# Altium footprint library Components.PcbLib: 260 footprints (part 1 of 17)
Each footprint in its own frame and in the unit in brackets; x right, y up, seen from the top. Pads: shape width x height; smd on the part's side, far side on the other; paste and mask are expansions set on the pad; w line width, h text height; cw(c..) or ccw(c..) is an arc to the next point about the centre after c.
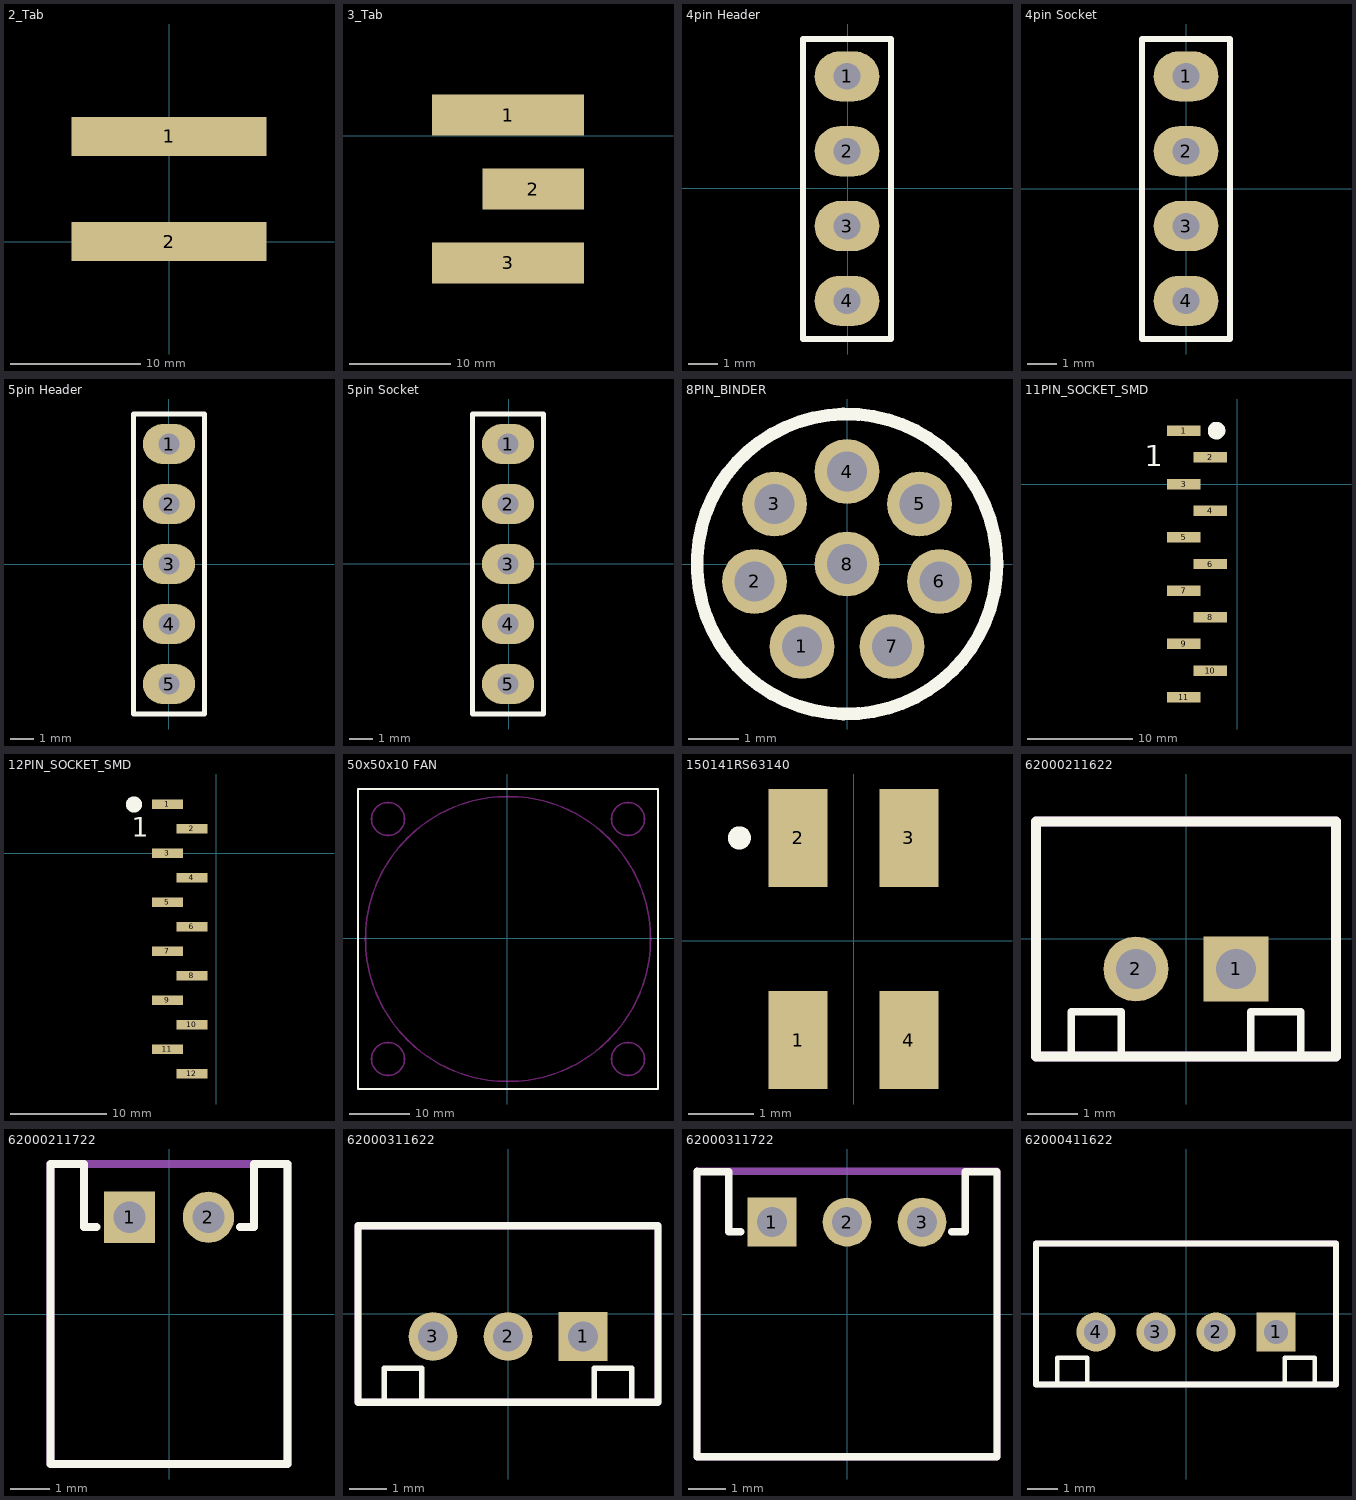
[diagram p0: the footprints below, top view; thin cyan lines are the x and y axes]

## 2_Tab [mm] "3mmx15mm TAB for LV_module (2017)"
pads (2):
  rect 15x3 smd: 1(0,8.1) 2(0,0)

## 3_Tab [mm]
pads (3):
  rect 15x4 smd: 1(-30.775,2.05) 3(-30.775,-12.55)
  rect 10x4 smd: 2(-28.275,-5.25)

## 4pin Header [mm]
pads (4):
  oval 2.2x1.7 hole 0.9: 1(-0.025,3.8) 2(-0.025,1.26) 3(-0.025,-1.28) 4(-0.025,-3.82)
Top Overlay:
  lines w0.2: -1.525,-5.115 1.475,-5.115 1.475,5.07 -1.525,5.07 -1.525,-5.115
3D body "BG030-04-X-0450-0300-X-X_revG.step": height 7.03, standoff -3.01, extent -1.27,-5.09 1.23,5.07

## 4pin Socket [mm]
pads (4):
  oval 2.2x1.7 hole 0.9: 1(0,3.82) 2(0,1.28) 3(0,-1.26) 4(0,-3.8)
Top Overlay:
  lines w0.2: -1.5,-5.095 1.5,-5.095 1.5,5.09 -1.5,5.09 -1.5,-5.095
3D body "tuskesor2_asm.stp": height 8.5, standoff -3.5, extent -1.5,-5.505 1.5,5.395

## 5pin Header [mm]
pads (5):
  oval 2.2x1.7 hole 0.9: 1(0,5.1) 2(0,2.56) 3(0,0.02) 4(0,-2.52) 5(0,-5.06)
Top Overlay:
  lines w0.2: -1.5,-6.33 -1.5,6.37 1.5,6.37 1.5,-6.33 -1.5,-6.33
3D body "BG030-05-X-0450-0300-X-X_revG.step": height 7.03, standoff -3.01, extent -1.245,-6.33 1.255,6.37

## 5pin Socket [mm]
pads (5):
  oval 2.2x1.7 hole 0.9: 1(-0.025,5.075) 2(-0.025,2.535) 3(-0.025,-0.005) 4(-0.025,-2.545) 5(-0.025,-5.085)
Top Overlay:
  lines w0.2: -1.525,-6.355 -1.525,6.345 1.475,6.345 1.475,-6.355 -1.525,-6.355
3D body "BG130-05-X-0350-X-X_revE.step": height 8.5, standoff -3.5, extent -1.525,-6.75 1.475,6.75

## 8PIN_BINDER [mm]
pads (8):
  round 1.3 hole 0.8: 1(-0.9,-1.65) 2(-1.85,-0.35) 3(-1.45,1.2) 4(0,1.85) 5(1.45,1.2) 6(1.85,-0.35) 7(0.9,-1.65) 8(0,0)
Top Overlay:
  circle w0.254: c0,0 r3
3D body "09-0428-90-08.stp": height 2.8, standoff -11.9, extent -7.5,-7.5 7.5,7.5

## 11PIN_SOCKET_SMD [mm]
pads (11):
  rect 3.2x1 smd: 1(-5.08,5.08) 2(-2.54,2.54) 3(-5.08,0) 4(-2.54,-2.54) 5(-5.08,-5.08) 6(-2.54,-7.62) 7(-5.08,-10.16) 8(-2.54,-12.7) 9(-5.08,-15.24) 10(-2.54,-17.78) 11(-5.08,-20.32)
Top Overlay:
  circle w1: c-1.96,5.1 r0.335
  text "1" at -8.8,1.7 h2

## 12PIN_SOCKET_SMD [mm]
pads (12):
  rect 3.2x1 smd: 1(-5.08,5.08) 2(-2.54,2.54) 3(-5.08,0) 4(-2.54,-2.54) 5(-5.08,-5.08) 6(-2.54,-7.62) 7(-5.08,-10.16) 8(-2.54,-12.7) 9(-5.08,-15.24) 10(-2.54,-17.78) 11(-5.08,-20.32) 12(-2.54,-22.86)
Top Overlay:
  circle w1: c-8.56,5.075 r0.335
  text "1" at -8.8,1.7 h2

## 50x50x10 FAN [mm]
Top Overlay:
  lines w0.254: -24.9,-25.1 -24.9,24.9 25.1,24.9 25.1,-25.1 -24.9,-25.1
Multi-Layer keep-out:
  circle w0.254: c0.1,-0.1 r23.75
  circle w0.254: c-19.9,19.9 r2.75
  circle w0.254: c-19.9,-20.1 r2.75
  circle w0.254: c20.1,-20.1 r2.75
  circle w0.254: c20.1,19.9 r2.75
3D body "JAMICO FAN 50X50X10.stp": height 10, standoff 0, extent -25.4,-25.6 25.6,25.4

## 150141RS63140 [mm]
pads (4):
  rect 0.9x1.5 smd: 1(-0.85,-1.525) 2(-0.85,1.575) 3(0.85,1.575) 4(0.85,-1.525)
Top Overlay:
  circle w0.254: c-1.75,1.575 r0.05

## 62000211622 [mm] "2.00mm Male Vertical Shrouded Header, 2p"
height 6.1
pads (2):
  rect 1.3x1.3 hole 0.8: 1(1,-0.6)
  round 1.3 hole 0.8: 2(-1,-0.6)
Top Overlay:
  lines w0.15: -2.3,-2.35 -2.3,-1.45 -1.3,-1.45 -1.3,-2.35 ; 1.3,-2.35 1.3,-1.45 2.3,-1.45 2.3,-2.35
  lines w0.2: -3,-2.35 3,-2.35 3,2.35 -3,2.35 -3,-2.35
Mechanical 13:
  lines w0.2: -3,-2.35 -3,2.35 3,2.35 3,-2.35 -3,-2.35
3D body "62000211622.stp": height 6.15, standoff -3.35, extent -3,-2.35 3,2.35

## 62000211722 [mm] "2.00mm Male Horizontal Shrouded Header, 2p"
height 4.5
pads (2):
  rect 1.3x1.3 hole 0.8: 1(-1,2.45)
  round 1.3 hole 0.8: 2(1,2.45)
Top Overlay:
  lines w0.2: -1.84,2.2 -2.15,2.2 -2.15,3.8 -3,3.8 -3,-3.8 3,-3.8 3,3.8 2.15,3.8 2.15,2.2 1.8,2.2
Mechanical 13:
  lines w0.2: -3,-3.8 -3,3.8 3,3.8 3,-3.8 -3,-3.8
3D body "62000211722.stp": height 4.85, standoff -3.24, extent -3,-3.8 3,3.8

## 62000311622 [mm] "2.00mm Male Vertical Shrouded Header, 3p"
height 6.1
pads (3):
  rect 1.3x1.3 hole 0.8: 1(2,-0.6)
  round 1.3 hole 0.8: 2(0,-0.6) 3(-2,-0.6)
Top Overlay:
  lines w0.15: -3.3,-2.35 -3.3,-1.45 -2.3,-1.45 -2.3,-2.35 ; 2.3,-2.35 2.3,-1.45 3.3,-1.45 3.3,-2.35
  lines w0.2: -4,-2.35 -4,2.35 4,2.35 4,-2.35 -4,-2.35
Mechanical 13:
  lines w0.2: -4,-2.35 4,-2.35 4,2.35 -4,2.35 -4,-2.35
3D body "62000311622.stp": height 6.15, standoff -3.35, extent -4,-2.35 4,2.35

## 62000311722 [mm] "2.00mm Male Horizontal Shrouded Header, 3p"
height 4.5
pads (3):
  rect 1.3x1.3 hole 0.8: 1(-2,2.45)
  round 1.3 hole 0.8: 2(0,2.45) 3(2,2.45)
Top Overlay:
  lines w0.2: -2.84,2.2 -3.15,2.2 -3.15,3.8 -4,3.8 -4,-3.8 4,-3.8 4,3.8 3.15,3.8 3.15,2.2 2.8,2.2
Mechanical 13:
  lines w0.2: -4,-3.8 -4,3.8 4,3.8 4,-3.8 -4,-3.8
3D body "62000311722.stp": height 4.85, standoff -3.24, extent -4,-3.8 4,3.8

## 62000411622 [mm] "2.00mm Male Vertical Shrouded Header, 4p"
height 6.1
pads (4):
  rect 1.3x1.3 hole 0.8: 1(3,-0.6)
  round 1.3 hole 0.8: 2(1,-0.6) 3(-1,-0.6) 4(-3,-0.6)
Top Overlay:
  lines w0.15: -4.3,-2.35 -4.3,-1.45 -3.3,-1.45 -3.3,-2.35 ; 3.3,-2.35 3.3,-1.45 4.3,-1.45 4.3,-2.35
  lines w0.2: -5,-2.35 -5,2.35 5,2.35 5,-2.35 -5,-2.35
Mechanical 13:
  lines w0.2: -5,-2.35 5,-2.35 5,2.35 -5,2.35 -5,-2.35
3D body "62000411622.stp": height 6.15, standoff -3.35, extent -5,-2.4 5,2.3